# Altium footprint library test_lib.PcbLib: 57 footprints (part 3 of 4)
Each footprint in its own frame and in the unit in brackets; x right, y up, seen from the top. Pads: shape width x height; smd on the part's side, far side on the other; paste and mask are expansions set on the pad; w line width, h text height; cw(c..) or ccw(c..) is an arc to the next point about the centre after c.
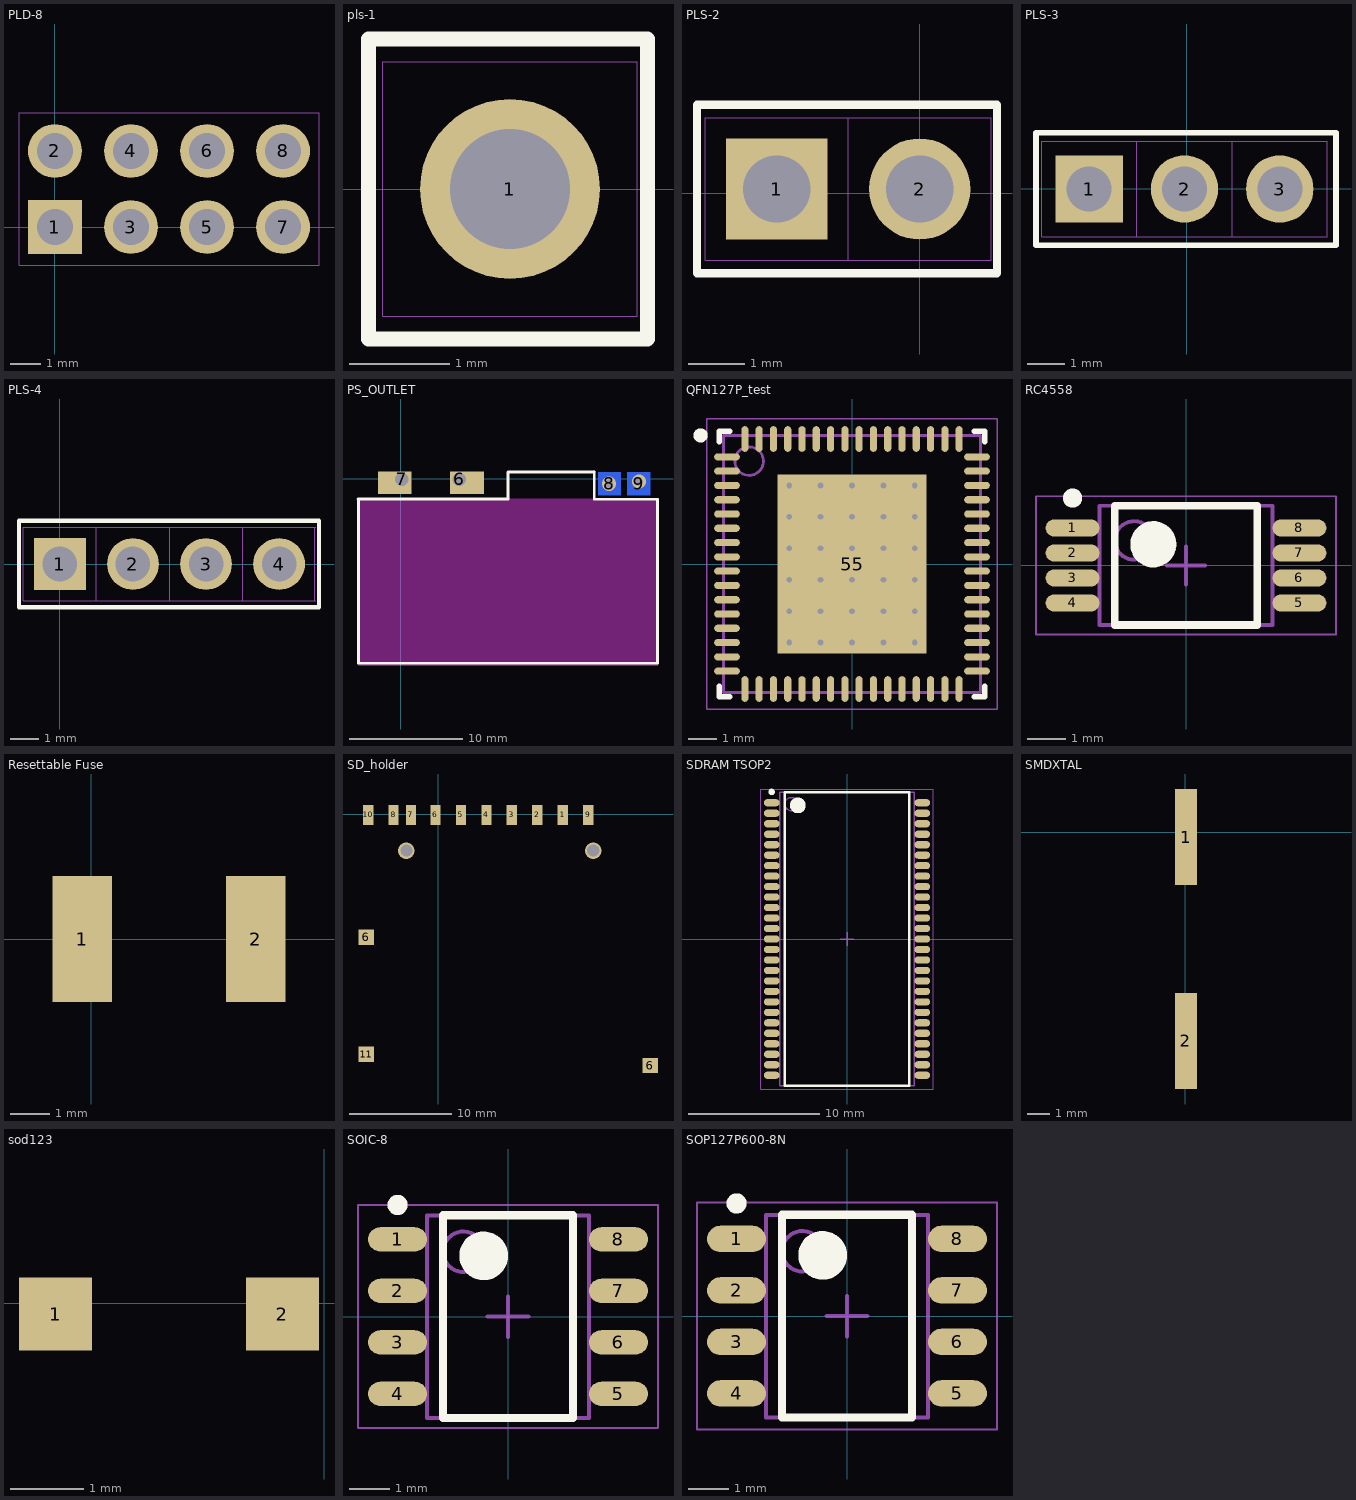
[diagram p2: the footprints below, top view; thin cyan lines are the x and y axes]

## PLD-8 [mm] "2.54"
pads (8):
  rect 1.8x1.8 hole 1.2: 1(0,0)
  round 1.8 hole 1.2: 2(0,2.54) 3(2.54,0) 4(2.54,2.54) 5(5.08,0) 6(5.08,2.54) 7(7.62,0) 8(7.62,2.54)
Mechanical 1:
  lines w0.01: -1.2,-1.27 3.81,-1.27 8.82,-1.27 8.82,3.81 3.81,3.81 -1.2,3.81 -1.2,-1.27
3D body "User Library-PLD-8.step": height 8.5, standoff -3, extent -1.31,-1.21 8.85,3.79

## pls-1 [mm]
pads (1):
  round 1.8 hole 1.2: 1(2.54,0)
Top Overlay:
  lines w0.15: 1.125,-1.5 3.915,-1.5 3.915,1.5 1.125,1.5 1.125,-1.5
Mechanical 1:
  lines w0.01: 1.27,-1.27 3.81,-1.27 3.81,1.27 1.27,1.27 1.27,-1.27
3D body "User Library-PLS1-1.STEP": height 8.54, standoff -3, extent 1.27,-1.27 3.81,1.27

## PLS-2 [mm]
pads (2):
  rect 1.8x1.8 hole 1.2: 1(-2.54,0.075)
  round 1.8 hole 1.2: 2(0,0.075)
Top Overlay:
  lines w0.15: -3.96,-1.425 -3.96,1.575 1.375,1.575 1.375,-1.425 -3.96,-1.425
Mechanical 1:
  lines w0.01: -1.27,-1.195 1.27,-1.195 1.27,1.345 -1.27,1.345 ; -1.27,-1.195 -3.81,-1.195 -3.81,1.345 -1.27,1.345 ; -1.27,-1.195 -1.27,1.345
3D body "User Library-PLS2.STEP": height 8.54, standoff -3, extent -3.81,-1.195 1.27,1.345

## PLS-3 [mm]
pads (3):
  rect 1.8x1.8 hole 1.2: 1(-2.605,-0.005)
  round 1.8 hole 1.2: 2(-0.065,-0.005) 3(2.475,-0.005)
Top Overlay:
  lines w0.15: -4.025,-1.505 3.975,-1.505 3.975,1.495 -4.025,1.495 -4.025,-1.505
Mechanical 1:
  lines w0.01: -1.335,-1.275 -1.335,1.265 ; -1.335,-1.275 -3.875,-1.275 -3.875,1.265 -1.335,1.265 ; -1.335,-1.275 1.205,-1.275 ; -1.335,1.265 1.205,1.265 ; 1.205,-1.275 3.745,-1.275 3.745,1.265 1.205,1.265 ; 1.205,-1.275 1.205,1.265

## PLS-4 [mm]
pads (4):
  rect 1.8x1.8 hole 1.2: 1(0,0)
  round 1.8 hole 1.2: 2(2.54,0) 3(5.08,0) 4(7.62,0)
Top Overlay:
  lines w0.15: 9,-1.5 -1.42,-1.5 -1.42,1.5 9,1.5 ; 9.005,-1.5 9.005,1.5
Mechanical 1:
  lines w0.01: 3.81,1.27 1.27,1.27 ; 8.865,-1.27 8.865,1.27 ; 8.89,-1.27 6.35,-1.27 ; 8.89,1.275 6.35,1.275 ; 1.27,-1.27 3.81,-1.27 ; 1.27,-1.27 -1.27,-1.27 -1.27,1.27 1.27,1.27 ; 1.27,-1.27 1.27,1.27 ; 3.81,-1.27 3.81,1.275 6.35,1.275 ; 3.81,-1.27 6.35,-1.27 ; 6.35,-1.27 6.35,1.275
3D body "User Library-1x4 TH Pitch 2_54mm.STEP": height 9.2, standoff -3.5, extent -1.28,-1.245 8.88,1.295

## PS_OUTLET [mm]
pads (4):
  rect 3x2 hole 1.2 copper offset 0.7,-0.3: 6(5.15,-0.025)
  rect 3x2 hole 1.2 copper offset -0.6,-0.3: 7(0.05,-0.025)
  rect 2x2 smd far side: 8(18.425,-0.425)
  rect 2x2 smd far side mask+0.102: 9(21.025,-0.425)
via 21.042,-0.225 diameter 1.27 hole 0.711
via 18.392,-0.425 diameter 1.27 hole 0.711
Top Overlay:
  pour cut-out: -3.74,-1.835
  lines w0.254: -3.8,-1.775 -3.74,-1.835 -3.74,-16.305 22.676,-16.305 22.676,-1.795 17.088,-1.795 17.088,0.618 9.468,0.618 9.468,-1.795 9.448,-1.775 -3.8,-1.775
Keep-Out Layer:
  board cut-out: -3.715,-16.525 -3.715,-1.775 8.975,-1.775 22.725,-1.775 22.725,-16.525
Mechanical 1:
  lines w0.254: 17.088,0.618 17.088,0.618

## QFN127P_test [mm]
height 1
pads (65):
  oval 0.9x0.25 smd: 1(-4.375,3.75) 2(-4.375,3.25) 3(-4.375,2.75) 4(-4.375,2.25) 5(-4.375,1.75) 6(-4.375,1.25) 7(-4.375,0.75) 8(-4.375,0.25) 9(-4.375,-0.25) 10(-4.375,-0.75) 11(-4.375,-1.25) 12(-4.375,-1.75) 13(-4.375,-2.25) 14(-4.375,-2.75) 15(-4.375,-3.25) 16(-4.375,-3.75) 33(4.375,-3.75) 34(4.375,-3.25) 35(4.375,-2.75) 36(4.375,-2.25) 37(4.375,-1.75) 38(4.375,-1.25) 39(4.375,-0.75) 40(4.375,-0.25) 41(4.375,0.25) 42(4.375,0.75) 43(4.375,1.25) 44(4.375,1.75) 45(4.375,2.25) 46(4.375,2.75) 47(4.375,3.25) 48(4.375,3.75)
  oval 0.25x0.9 smd: 17(-3.75,-4.375) 18(-3.25,-4.375) 19(-2.75,-4.375) 20(-2.25,-4.375) 21(-1.75,-4.375) 22(-1.25,-4.375) 23(-0.75,-4.375) 24(-0.25,-4.375) 25(0.25,-4.375) 26(0.75,-4.375) 27(1.25,-4.375) 28(1.75,-4.375) 29(2.25,-4.375) 30(2.75,-4.375) 31(3.25,-4.375) 32(3.75,-4.375) 49(3.75,4.375) 50(3.25,4.375) 51(2.75,4.375) 52(2.25,4.375) 53(1.75,4.375) 54(1.25,4.375) 55(0.75,4.375) 56(0.25,4.375) 57(-0.25,4.375) 58(-0.75,4.375) 59(-1.25,4.375) 60(-1.75,4.375) 61(-2.25,4.375) 62(-2.75,4.375) 63(-3.25,4.375) 64(-3.75,4.375)
  rect 5.21x6.25 smd: 55(0,0)
via 2.2,-2.75 diameter 0.5 hole 0.2
via 1.1,-2.75 diameter 0.5 hole 0.2
via 0,-2.75 diameter 0.5 hole 0.2
via -1.1,-2.75 diameter 0.5 hole 0.2
via -2.2,-2.75 diameter 0.5 hole 0.2
via 2.2,-1.65 diameter 0.5 hole 0.2
via 1.1,-1.65 diameter 0.5 hole 0.2
via 0,-1.65 diameter 0.5 hole 0.2
via -1.1,-1.65 diameter 0.5 hole 0.2
via -2.2,-1.65 diameter 0.5 hole 0.2
via 2.2,-0.55 diameter 0.5 hole 0.2
via 1.1,-0.55 diameter 0.5 hole 0.2
via 0,-0.55 diameter 0.5 hole 0.2
via -1.1,-0.55 diameter 0.5 hole 0.2
via -2.2,-0.55 diameter 0.5 hole 0.2
via 2.2,0.55 diameter 0.5 hole 0.2
via 1.1,0.55 diameter 0.5 hole 0.2
via 0,0.55 diameter 0.5 hole 0.2
via -1.1,0.55 diameter 0.5 hole 0.2
via -2.2,0.55 diameter 0.5 hole 0.2
via 2.2,1.65 diameter 0.5 hole 0.2
via 1.1,1.65 diameter 0.5 hole 0.2
via 0,1.65 diameter 0.5 hole 0.2
via -1.1,1.65 diameter 0.5 hole 0.2
via -2.2,1.65 diameter 0.5 hole 0.2
via 2.2,2.75 diameter 0.5 hole 0.2
via 1.1,2.75 diameter 0.5 hole 0.2
via 0,2.75 diameter 0.5 hole 0.2
via -1.1,2.75 diameter 0.5 hole 0.2
via -2.2,2.75 diameter 0.5 hole 0.2
Top Overlay:
  circle w0.25: c-5.3,4.5 r0.125
  lines w0.2: -4.65,-4.275 -4.65,-4.65 -4.275,-4.65 ; -4.65,4.275 -4.65,4.65 -4.275,4.65 ; 4.275,-4.65 4.65,-4.65 4.65,-4.275 ; 4.275,4.65 4.65,4.65 4.65,4.275
Mechanical 13:
  circle w0.1: c-3.6,3.6 r0.5
  lines w0.1: -4.5,-4.5 4.5,-4.5 4.5,4.5 -4.5,4.5 -4.5,-4.5
Mechanical 15:
  lines w0.05: -5.075,-5.075 5.075,-5.075 5.075,5.075 -5.075,5.075 -5.075,-5.075
  lines w0.1: -0.5,0 0.5,0 ; 0,-0.5 0,0.5
3D body: height 1, standoff 0, extent -4.5,-4.5 4.5,4.5

## RC4558 [mm] "TSOP, 8-Leads, RC4558 operation amplifier"
height 1.2
pads (8):
  oval 1.4x0.45 smd: 1(-2.95,0.975) 2(-2.95,0.325) 3(-2.95,-0.325) 4(-2.95,-0.975) 5(2.95,-0.975) 6(2.95,-0.325) 7(2.95,0.325) 8(2.95,0.975)
Top Overlay:
  circle w0.6: c-0.85,0.55 r0.3
  circle w0.25: c-2.95,1.75 r0.125
  lines w0.2: -1.85,-1.55 1.85,-1.55 1.85,1.55 -1.85,1.55 -1.85,-1.55
Mechanical 13:
  circle w0.1: c-1.35,0.65 r0.5
  lines w0.1: -2.25,-1.55 2.25,-1.55 2.25,1.55 -2.25,1.55 -2.25,-1.55
Mechanical 15:
  lines w0.05: -3.9,-1.8 3.9,-1.8 3.9,1.8 -3.9,1.8 -3.9,-1.8
  lines w0.1: -0.5,0 0.5,0 ; 0,-0.5 0,0.5
3D body: height 1.2, standoff 0.1, extent -2.25,-1.55 2.25,1.55

## Resettable Fuse [mm] "MF-MSMF"
pads (2):
  rect 1.5x3.2 smd: 1(-0.225,0) 2(4.175,0)

## SD_holder [mm] "SD card holder 7SDCN"
pads (13):
  rect 1x2 smd: 1(12.2,-0.05) 2(9.7,-0.05) 3(7.2,-0.05) 4(4.7,-0.05) 5(2.2,-0.05) 6(-0.3,-0.05) 7(-2.7,-0.05) 8(-4.4,-0.05) 9(14.7,-0.05) 10(-6.9,-0.05)
  rect 1.5x1.5 smd: 6(-7.1,-12.05) 6(20.8,-24.65) 11(-7.1,-23.55)
via 15.2,-3.55 diameter 1.6 hole 1.2
via -3.15,-3.55 diameter 1.6 hole 1.2
3D body "socket_a-sd-09-c-a-1-3.stp": height 2.65, standoff -0.7, extent -8.55,-28.85 20.25,1.45

## SDRAM TSOP2 [mm] "W9812G6KH"
height 1.2
pads (54):
  oval 1.2x0.55 smd mask+0.05: 1(-5.75,10.4) 2(-5.75,9.6) 3(-5.75,8.8) 4(-5.75,8) 5(-5.75,7.2) 6(-5.75,6.4) 7(-5.75,5.6) 8(-5.75,4.8) 9(-5.75,4) 10(-5.75,3.2) 11(-5.75,2.4) 12(-5.75,1.6) 13(-5.75,0.8) 14(-5.75,0) 15(-5.75,-0.8) 16(-5.75,-1.6) 17(-5.75,-2.4) 18(-5.75,-3.2) 19(-5.75,-4) 20(-5.75,-4.8) 21(-5.75,-5.6) 22(-5.75,-6.4) 23(-5.75,-7.2) 24(-5.75,-8) 25(-5.75,-8.8) 26(-5.75,-9.6) 27(-5.75,-10.4) 28(5.75,-10.4) 29(5.75,-9.6) 30(5.75,-8.8) 31(5.75,-8) 32(5.75,-7.2) 33(5.75,-6.4) 34(5.75,-5.6) 35(5.75,-4.8) 36(5.75,-4) 37(5.75,-3.2) 38(5.75,-2.4) 39(5.75,-1.6) 40(5.75,-0.8) 41(5.75,0) 42(5.75,0.8) 43(5.75,1.6) 44(5.75,2.4) 45(5.75,3.2) 46(5.75,4) 47(5.75,4.8) 48(5.75,5.6) 49(5.75,6.4) 50(5.75,7.2) 51(5.75,8) 52(5.75,8.8) 53(5.75,9.6) 54(5.75,10.4)
Top Overlay:
  circle w0.6: c-3.75,10.2 r0.3
  circle w0.25: c-5.75,11.225 r0.125
  lines w0.2: -4.75,-11.2 4.75,-11.2 4.75,11.2 -4.75,11.2 -4.75,-11.2
Mechanical 13:
  circle w0.1: c-4.25,10.3 r0.5
  lines w0.1: -5.15,-11.2 5.15,-11.2 5.15,11.2 -5.15,11.2 -5.15,-11.2
Mechanical 15:
  lines w0.05: -6.6,-11.45 6.6,-11.45 6.6,11.45 -6.6,11.45 -6.6,-11.45
  lines w0.1: -0.5,0 0.5,0 ; 0,-0.5 0,0.5
3D body: height 1.2, standoff 0.15, extent -5.15,-11.2 5.15,11.2

## SMDXTAL [mm]
pads (2):
  rect 1x4.36 smd: 1(0.025,-0.225) 2(0.025,-9.475)
3D body "User Library-Crystal HC49_US-SM.step": height 4.3, standoff 0, extent -2.39,-11.25 2.44,1.55

## sod123 [mm]
pads (2):
  rect 1x1 smd: 1(-3.675,-0.15) 2(-0.575,-0.15)
3D body "User Library-SOD123-1.step": height 1.18, standoff 0, extent -4.075,-1.05 -0.175,0.75

## SOIC-8 [mm] "SOIC, 8-Leads, Body 4,90x3,90mm, Pitch 1,27mm, IPC Medium Density"
height 1.65
pads (8):
  oval 1.45x0.6 smd: 1(-2.725,1.905) 2(-2.725,0.635) 3(-2.725,-0.635) 4(-2.725,-1.905) 5(2.725,-1.905) 6(2.725,-0.635) 7(2.725,0.635) 8(2.725,1.905)
Top Overlay:
  circle w0.25: c-2.725,2.755 r0.125
  circle w0.6: c-0.6,1.5 r0.3
  lines w0.2: -1.6,-2.5 -1.6,2.5 1.6,2.5 1.6,-2.5 -1.6,-2.5
Mechanical 13:
  circle w0.1: c-1.1,1.6 r0.5
  lines w0.1: -2,-2.5 -2,2.5 2,2.5 2,-2.5 -2,-2.5
Mechanical 15:
  lines w0.05: -3.7,-2.75 -3.7,2.75 3.7,2.75 3.7,-2.75 -3.7,-2.75
  lines w0.1: -0.5,0 0.5,0 ; 0,-0.5 0,0.5
3D body: height 1.65, standoff 0.25, extent -2,-2.5 2,2.5

## SOP127P600-8N [mm] "spi flash"
height 1.75
pads (8):
  oval 1.45x0.65 smd: 1(-2.725,1.905) 2(-2.725,0.635) 3(-2.725,-0.635) 4(-2.725,-1.905) 5(2.725,-1.905) 6(2.725,-0.635) 7(2.725,0.635) 8(2.725,1.905)
Top Overlay:
  circle w0.25: c-2.725,2.78 r0.125
  circle w0.6: c-0.6,1.5 r0.3
  lines w0.2: -1.6,-2.5 -1.6,2.5 1.6,2.5 1.6,-2.5 -1.6,-2.5
Mechanical 13:
  circle w0.1: c-1.1,1.6 r0.5
  lines w0.1: -2,-2.5 -2,2.5 2,2.5 2,-2.5 -2,-2.5
Mechanical 15:
  lines w0.05: -3.7,-2.8 -3.7,2.8 3.7,2.8 3.7,-2.8 -3.7,-2.8
  lines w0.1: -0.5,0 0.5,0 ; 0,-0.5 0,0.5
3D body: height 1.75, standoff 0.1, extent -2,-2.5 2,2.5

## SOP-8 [mm] "spi flash"